# Altium schematic symbol library LATTICEPLDS_Library.SchLib: 291 symbols (part 23 of 32) (continued)
## LFECP33E-F672/FN672 (continued)
part F pins: U7 TCK, U20 DONE, V3 TDO, V4 TDI, V5 TMS, V20 CCLK, V21 CFG1, V22 PROGRAMN, V23 CFG0, V24 CFG2, V25 INITN
part A text: CORE POWER; VCC_CORE; VCC_JTAG; VCC_AUX; VCC_PLL
part B text: I/O BANKS 0 & 1; BANK 0; BANK 1
part C text: I/O BANKS 2 & 3; BANK 2; BANK 3
part D text: I/O BANKS 4 & 5; BANK 4; BANK 5
part E text: I/O BANKS 6 & 7; BANK 6; BANK 7
part F text: PROGRAMMING/CONFIGURATION; JTAG

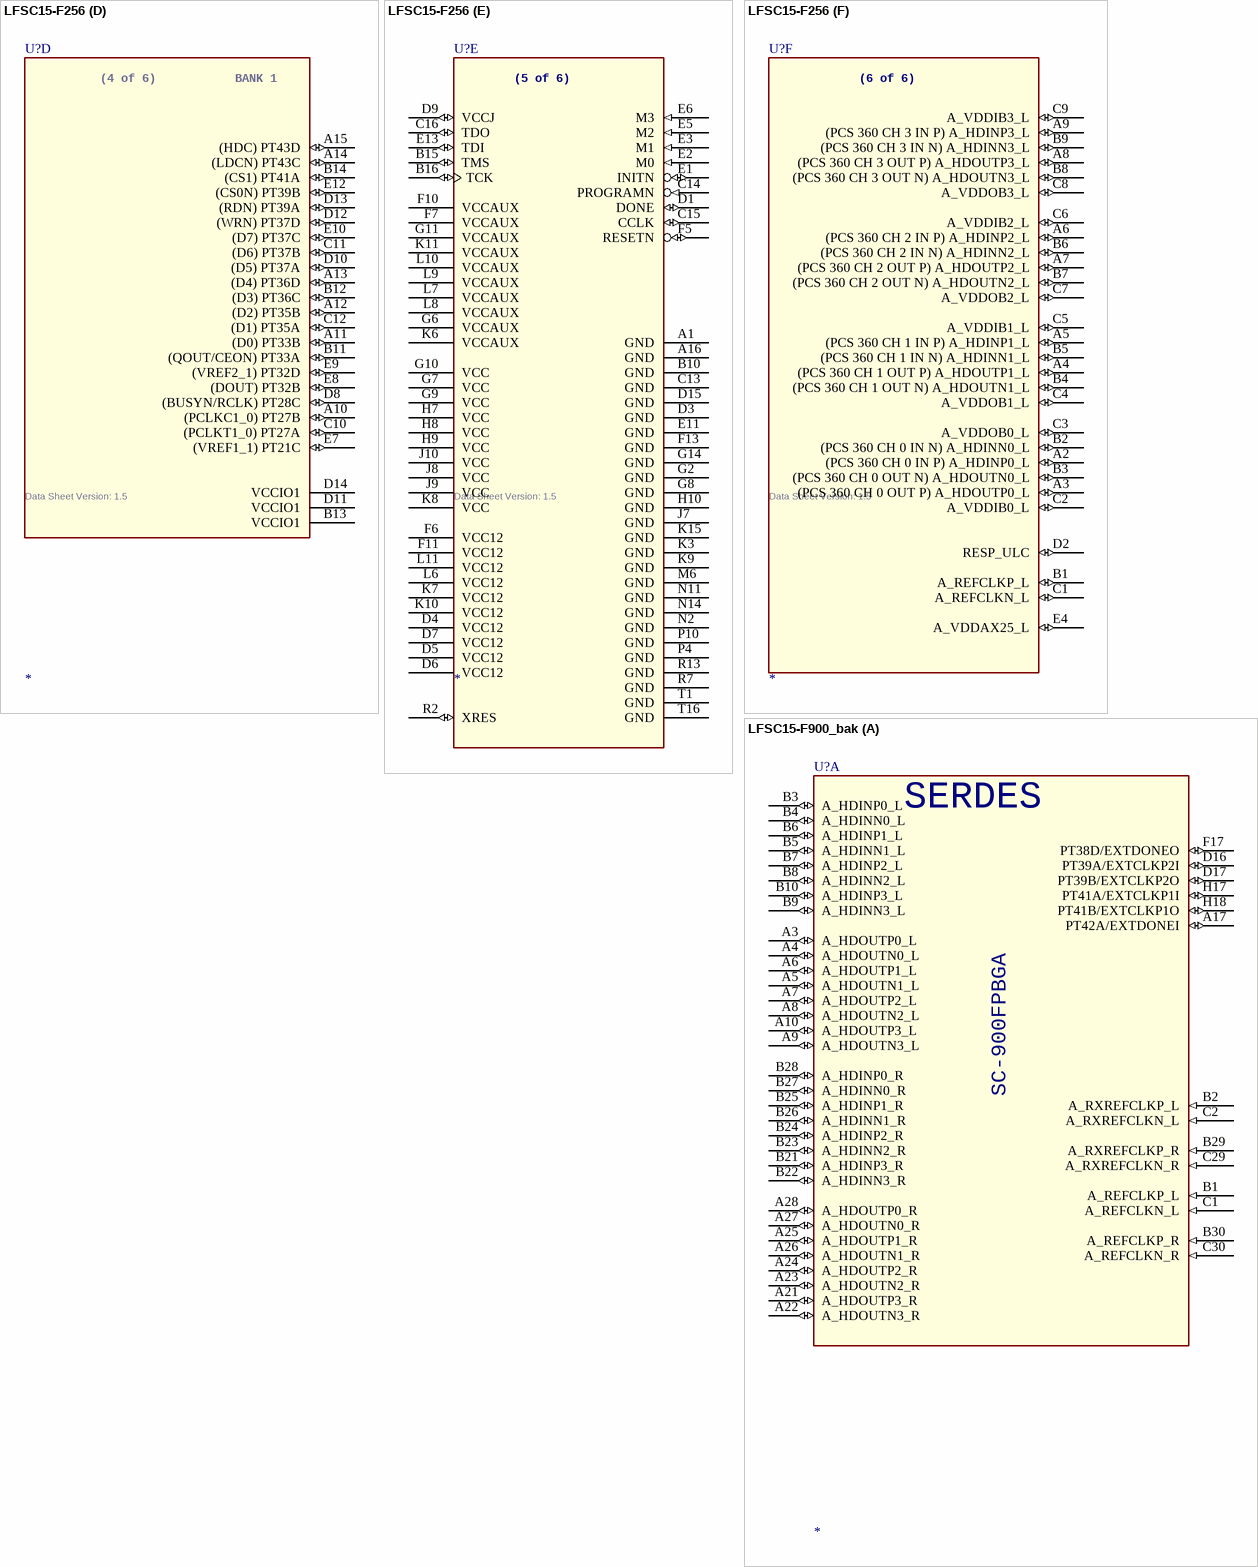
[diagram p224: symbols LFSC15-F256 to LFSC15-F900_bak]

## LFSC15-F256
designator U?  Data Sheet Version: 1.5
SPLIT_INST: TRUE; SWAP_INFO: (S1+S2+S3+S4+S5+S6)
part A pins: F1 PL15B (ULC_PLLC_IN_A/ULC_PLLC_FB_B) (io), F2 PL15A (ULC_PLLT_IN_A/ULC_PLLT_FB_B) (io), F3 PL17A (ULC_DLLT_IN_C/ULC_DLLT_FB_D) (io), F4 VCCIO7 (power), G1 PL17B (ULC_DLLC_IN_C/ULC_DLLC_FB_D) (io), G3 VCCIO7 (power), G4 PL18D (VREF2_7) (io), G5 PL22D (DIFFR_7) (io), H1 PL23A (PCLKT7_1) (io), H2 PL22B (io), H3 PL22A (io), H4 PL24C (PCLKT7_2) (io), H5 PL22C (VREF1_7) (io), H6 PL24D (PCLKC7_2) (io), J1 PL23B (PCLKC7_1) (io), J2 PL24A (PCLKT7_0) (io), J3 PL24B (PCLKC7_0) (io), J4 (PCLKT6_0) PL26A (io), J5 (PCLKT6_1) PL26C (io), J6 (PCLKC6_1) PL26D (io), K1 PL28A (io), K2 VCCIO6 (power), K4 (PCLKC6_2) PL28D (io), K5 (PCLKC6_0) PL26B (io), L1 PL28B (io), L2 (VREF1_6) PL31C (io), L3 PL35A (io), L4 (PCLKT6_2) PL28C (io), M1 PL37A (io), M2 (DIFFR_6) PL35D (io), M3 PL35B (io), M4 PL43B (io), M5 PL43A (io), N1 PL37B (io), N3 VCCIO6 (power), P1 (LLC_DLLT_IN_F/LLC_DLLT_FB_E) PL45A (io), P2 (VREF2_6) PL41D (io), P3 TEMP (io), R1 (LLC_DLLC_IN_F/LLC_DLLC_FB_E) PL45B (io)
part B pins: L5 PB13C (io), L12 PB43A (io), M7 PB15D (VREF2_5) (io), M8 PB21A (io), M9 PB21B (io), M10 (PCLKC4_2) PB35B (io), M11 VCCIO4 (power), M12 PB43B (io), M13 (LRC_DLLC_IN_C/LRC_DLLC_FB_D) PB48B (io), N4 PB3B (LLC_PLLC_IN_A/LLC_PLLC_FB_B) (io), N5 PB5D (VREF1_5) (io), N6 VCCIO5 (power), N7 PB17A (PCLKT5_2) (io), N8 PB17B (PCLKC5_2) (io), N9 PB31A (io), N10 PB31B (io), N12 PB39C (io), N13 (LRC_PLLT_IN_A/LRC_PLLT_FB_B) PB49A (io), N16 PB44B (io), P5 PB8A (io), P6 PB15A (PCLKT5_0) (io), P7 VCCIO5 (power), P8 PB24A (io), P9 PB24B (io), P11 (PCLKT4_2) PB35A (io), P12 (PCLKC4_1) PB36B (io), P13 VCCIO4 (power), P14 (LRC_PLLC_IN_A/LRC_PLLC_FB_B) PB49B (io), P15 (LRC_DLLT_IN_C/LRC_DLLT_FB_D) PB48A (io), P16 PB44A (io), R3 PB3A (LLC_PLLT_IN_A/LLC_PLLT_FB_B) (io), R4 VCCIO5 (power), R5 PB8B (io), R6 PB12A (PCLKT5_3) (io), R8 PB16A (PCLKT5_1) (io), R9 PB20A (io), R10 VCCIO4 (power), R11 PB28B (io), R12 PB32B (io), R14 (VREF1_4) PB47C (io), R15 (VREF2_4) PB37C (io), R16 (PCLKC4_3) PB40B (io), T2 PB3D (LLC_DLLC_IN_C/LLC_DLLC_FB_D) (io), T3 PB3C (LLC_DLLT_IN_C/LLC_DLLT_FB_D) (io), T4 PB9A (io), T5 PB9B (io), T6 PB12B (PCLKC5_3) (io), T7 PB15B (PCLKC5_0) (io), T8 PB16B (PCLKC5_1) (io), T9 PB20B (io), T10 PB28A (io), T11 PB32A (io), T12 (PCLKT4_1) PB36A (io), T13 (PCLKT4_0) PB37A (io), T14 (PCLKC4_0) PB37B (io), T15 (PCLKT4_3) PB40A (io)
part C pins: D16 (PCLKT2_2) PR24C (io), E14 (URC_PLLT_IN_A/URC_PLLT_FB_B) PR15A (io), E15 (URC_PLLC_IN_A/URC_PLLC_FB_B) PR15B (io), E16 (PCLKC2_2) PR24D (io), F8 PR22B (io), F9 PR22A (io), F12 VCCIO2 (power), F14 (URC_DLLT_IN_C/URC_DLLT_FB_D) PR17A (io), F15 (URC_DLLC_IN_C/URC_DLLC_FB_D)  PR17B (io), F16 PR28A (io), G12 (DIFFR_2) PR22D (io), G13 (VREF1_2) PR22C (io), G15 VCCIO2 (power), G16 (VREF2_2) PR18D (io), H11 (PCLKC2_0) PR24B (io), H12 (PCLKT2_0) PR24A (io), H13 (PCLKC2_1) PR23B (io), H14 (PCLKT2_1) PR23A  (io), H15 PR28B (io), H16 PR37A (io), J11 PR26D (PCLKC3_1) (io), J12 PR26C (PCLKT3_1) (io), J13 PR28D (PCLKC3_2) (io), J14 PR26A (PCLKT3_0) (io), J15 PR26B (PCLKC3_0) (io), J16 PR37B (io), K12 PR31C (VREF1_3) (io), K13 PR28C (PCLKT3_2) (io), K14 VCCIO3 (power), K16 PR41D (VREF2_3) (io), L13 PR35D (DIFFR_3) (io), L14 PR35B (io), L15 PR35A (io), L16 PR45A (LRC_DLLT_IN_F/LRC_DLLT_FB_E) (io), M14 PR43B (io), M15 PR43A (io), M16 PR45B (LRC_DLLC_IN_F/LRC_DLLC_FB_E) (io), N15 VCCIO3 (power)
part D pins: A10 (PCLKC1_0) PT27B (io), A11 (D0) PT33B (io), A12 (D2) PT35B (io), A13 (D4) PT36D (io), A14 (LDCN) PT43C (io), A15 (HDC) PT43D (io), B11 (QOUT/CEON) PT33A (io), B12 (D3) PT36C (io), B13 VCCIO1 (power), B14 (CS1) PT41A (io), C10 (PCLKT1_0) PT27A (io), C11 (D6) PT37B (io), C12 (D1) PT35A (io), D8 (BUSYN/RCLK) PT28C (io), D10 (D5) PT37A (io), D11 VCCIO1 (power), D12 (WRN) PT37D (io), D13 (RDN) PT39A (io), D14 VCCIO1 (power), E7 (VREF1_1) PT21C (io), E8 (DOUT) PT32B (io), E9 (VREF2_1) PT32D (io), E10 (D7) PT37C (io), E12 (CS0N) PT39B (io)
part E pins: A1 GND (power), A16 GND (power), B10 GND (power), B15 TMS (io), B16 TCK (io), C13 GND (power), C14 PROGRAMN (in), C15 CCLK (io), C16 TDO (io), D1 DONE (io), D3 GND (power), D4 VCC12 (power), D5 VCC12 (power), D6 VCC12 (power), D7 VCC12 (power), D9 VCCJ (io), D15 GND (power), E1 INITN (io), E2 M0 (in), E3 M1 (in), E5 M2 (in), E6 M3 (in), E11 GND (power), E13 TDI (io), F5 RESETN (io), F6 VCC12 (power), F7 VCCAUX (power), F10 VCCAUX (power), F11 VCC12 (power), F13 GND (power), G2 GND (power), G6 VCCAUX (power), G7 VCC (power), G8 GND (power), G9 VCC (power), G10 VCC (power), G11 VCCAUX (power), G14 GND (power), H7 VCC (power), H8 VCC (power), H9 VCC (power), H10 GND (power), J7 GND (power), J8 VCC (power), J9 VCC (power), J10 VCC (power), K3 GND (power), K6 VCCAUX (power), K7 VCC12 (power), K8 VCC (power), K9 GND (power), K10 VCC12 (power), K11 VCCAUX (power), K15 GND (power), L6 VCC12 (power), L7 VCCAUX (power), L8 VCCAUX (power), L9 VCCAUX (power), L10 VCCAUX (power), L11 VCC12 (power), M6 GND (power), N2 GND (power), N11 GND (power), N14 GND (power), P4 GND (power), P10 GND (power), R2 XRES (io), R7 GND (power), R13 GND (power), T1 GND (power), T16 GND (power)
part F pins: A2 (PCS 360 CH 0 IN P) A_HDINP0_L (io), A3 (PCS 360 CH 0 OUT P) A_HDOUTP0_L (io), A4 (PCS 360 CH 1 OUT P) A_HDOUTP1_L (io), A5 (PCS 360 CH 1 IN P) A_HDINP1_L (io), A6 (PCS 360 CH 2 IN P) A_HDINP2_L (io), A7 (PCS 360 CH 2 OUT P) A_HDOUTP2_L (io), A8 (PCS 360 CH 3 OUT P) A_HDOUTP3_L (io), A9 (PCS 360 CH 3 IN P) A_HDINP3_L (io), B1 A_REFCLKP_L (io), B2 (PCS 360 CH 0 IN N) A_HDINN0_L (io), B3 (PCS 360 CH 0 OUT N) A_HDOUTN0_L (io), B4 (PCS 360 CH 1 OUT N) A_HDOUTN1_L (io), B5 (PCS 360 CH 1 IN N) A_HDINN1_L (io), B6 (PCS 360 CH 2 IN N) A_HDINN2_L (io), B7 (PCS 360 CH 2 OUT N) A_HDOUTN2_L (io), B8 (PCS 360 CH 3 OUT N) A_HDOUTN3_L (io), B9 (PCS 360 CH 3 IN N) A_HDINN3_L (io), C1 A_REFCLKN_L (io), C2 A_VDDIB0_L (io), C3 A_VDDOB0_L (io), C4 A_VDDOB1_L (io), C5 A_VDDIB1_L (io), C6 A_VDDIB2_L (io), C7 A_VDDOB2_L (io), C8 A_VDDOB3_L (io), C9 A_VDDIB3_L (io), D2 RESP_ULC (io), E4 A_VDDAX25_L (io)
part A text: BANK 7; (1 of 6); BANK 6
part B text: BANK 5; (2 of 6); BANK 4
part C text: BANK 3; (3 of 6); BANK 2
part D text: (4 of 6); BANK 1
part E text: (5 of 6)
part F text: (6 of 6)

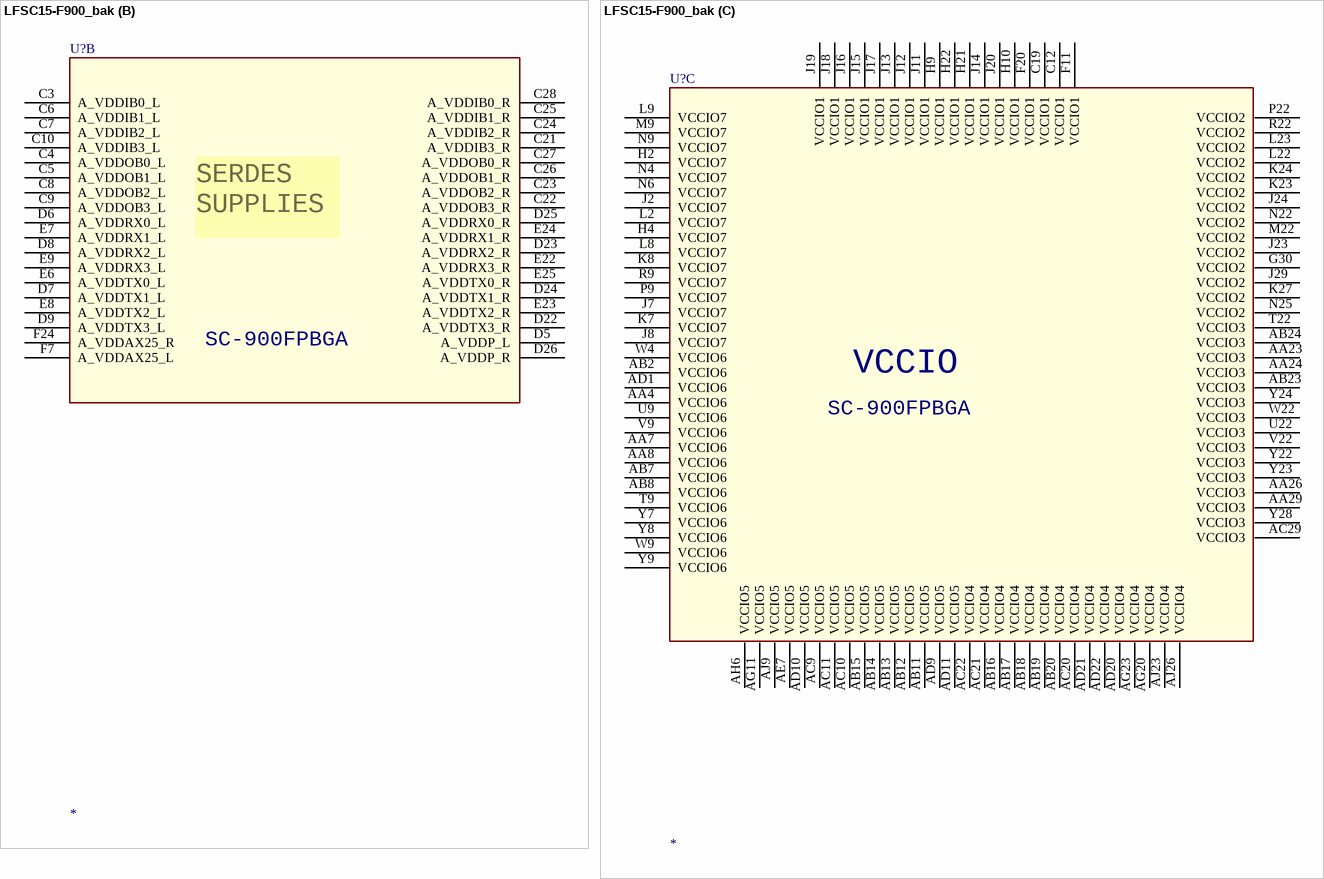
[diagram p225: symbol LFSC15-F900_bak]

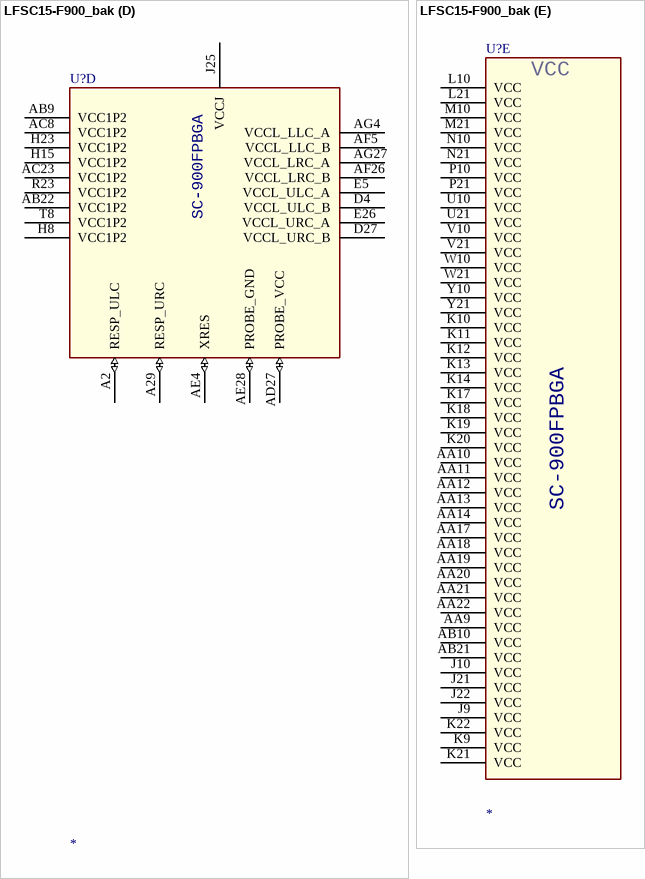
[diagram p226: symbol LFSC15-F900_bak]

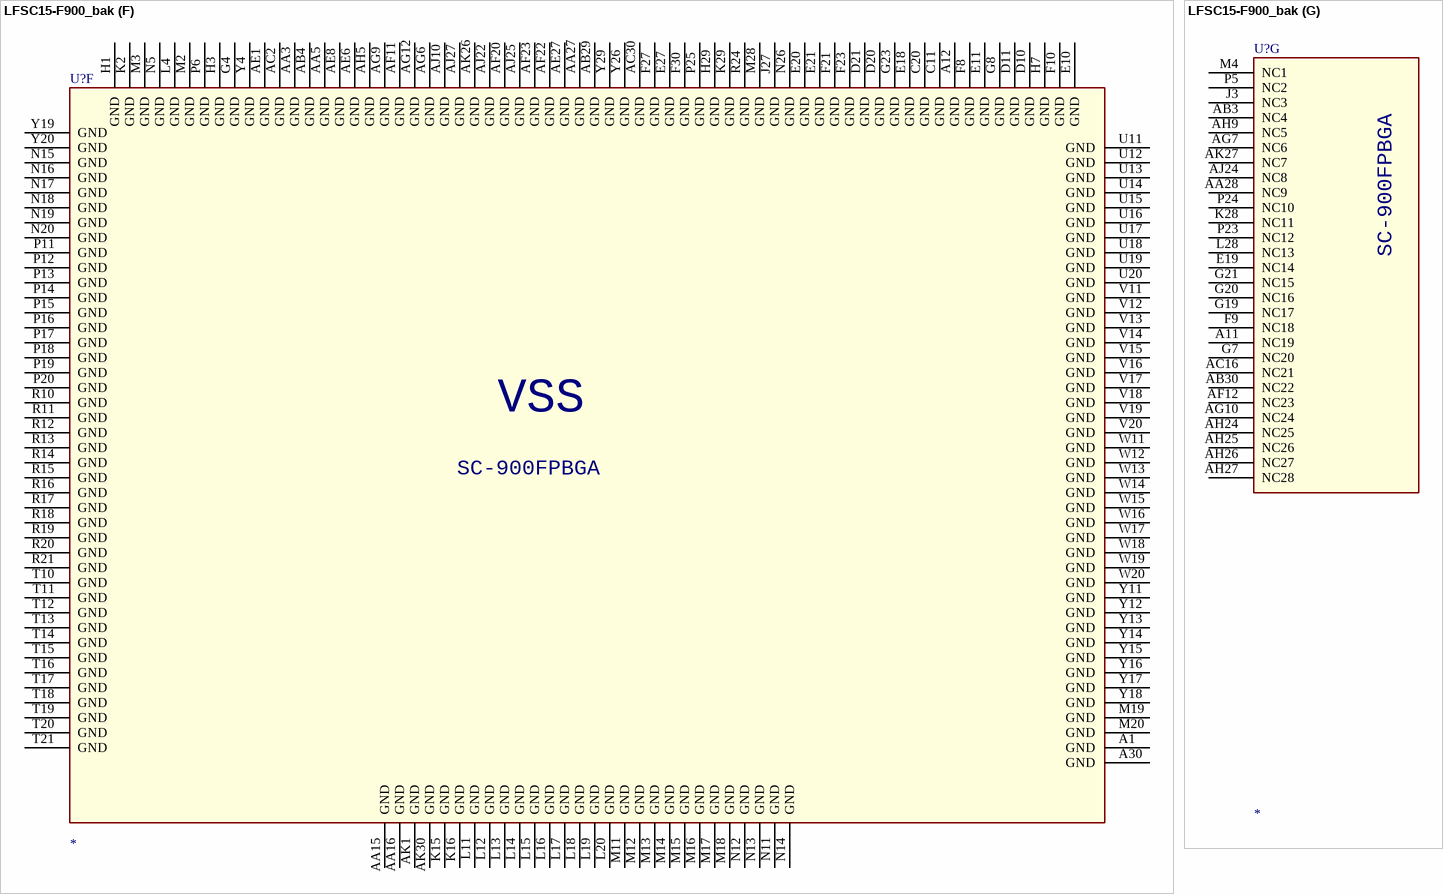
[diagram p227: symbol LFSC15-F900_bak]

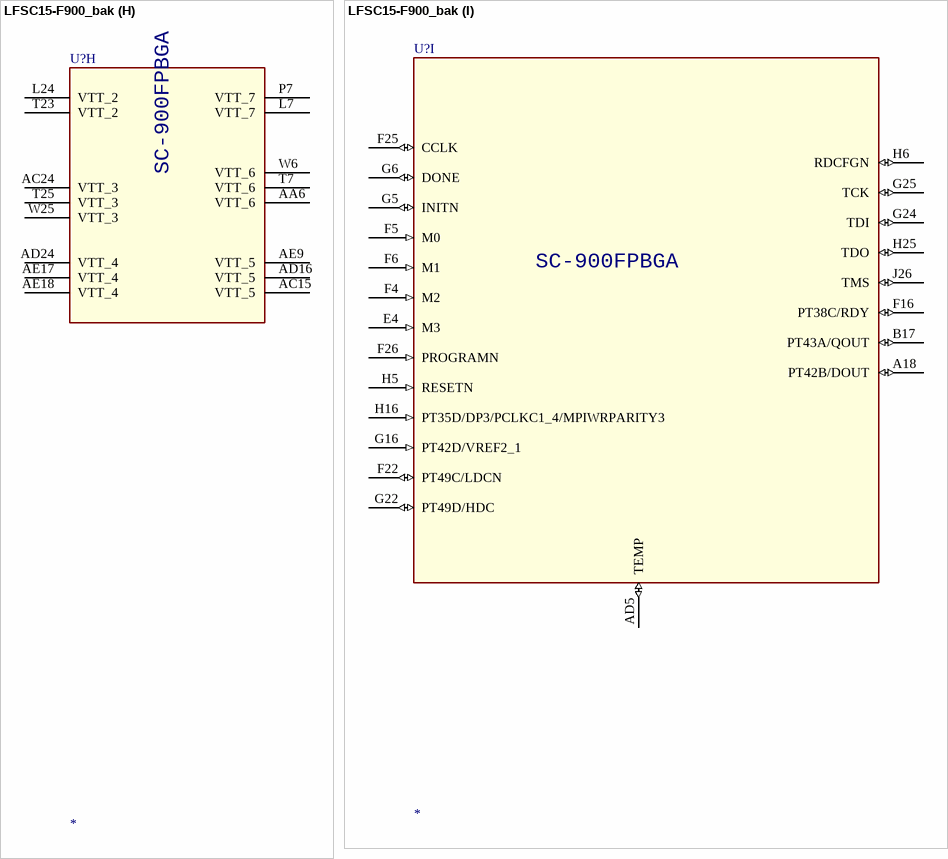
[diagram p228: symbol LFSC15-F900_bak]

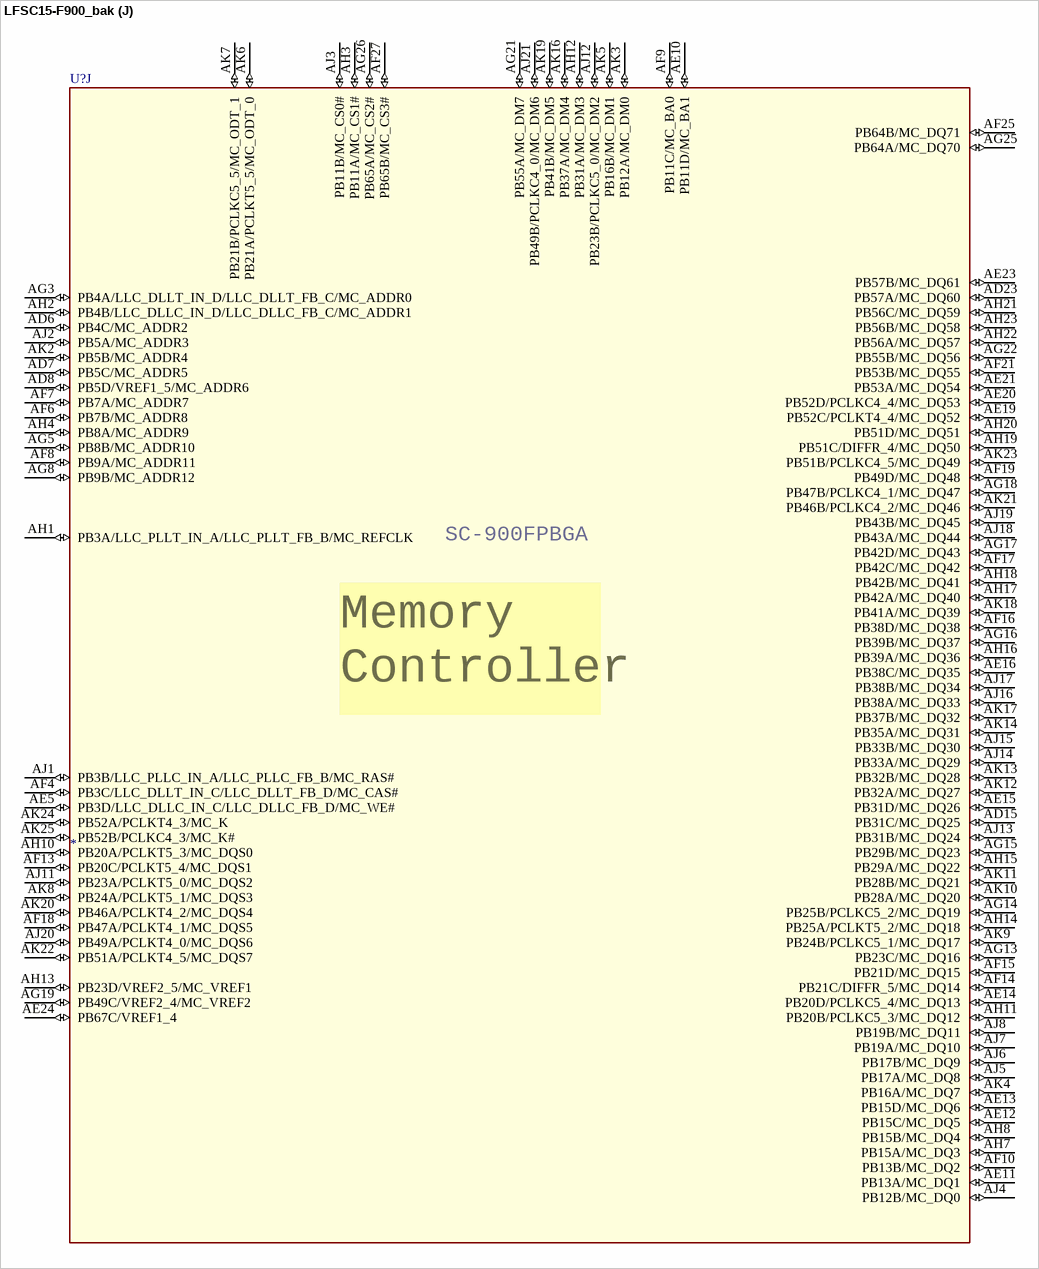
[diagram p229: symbol LFSC15-F900_bak]

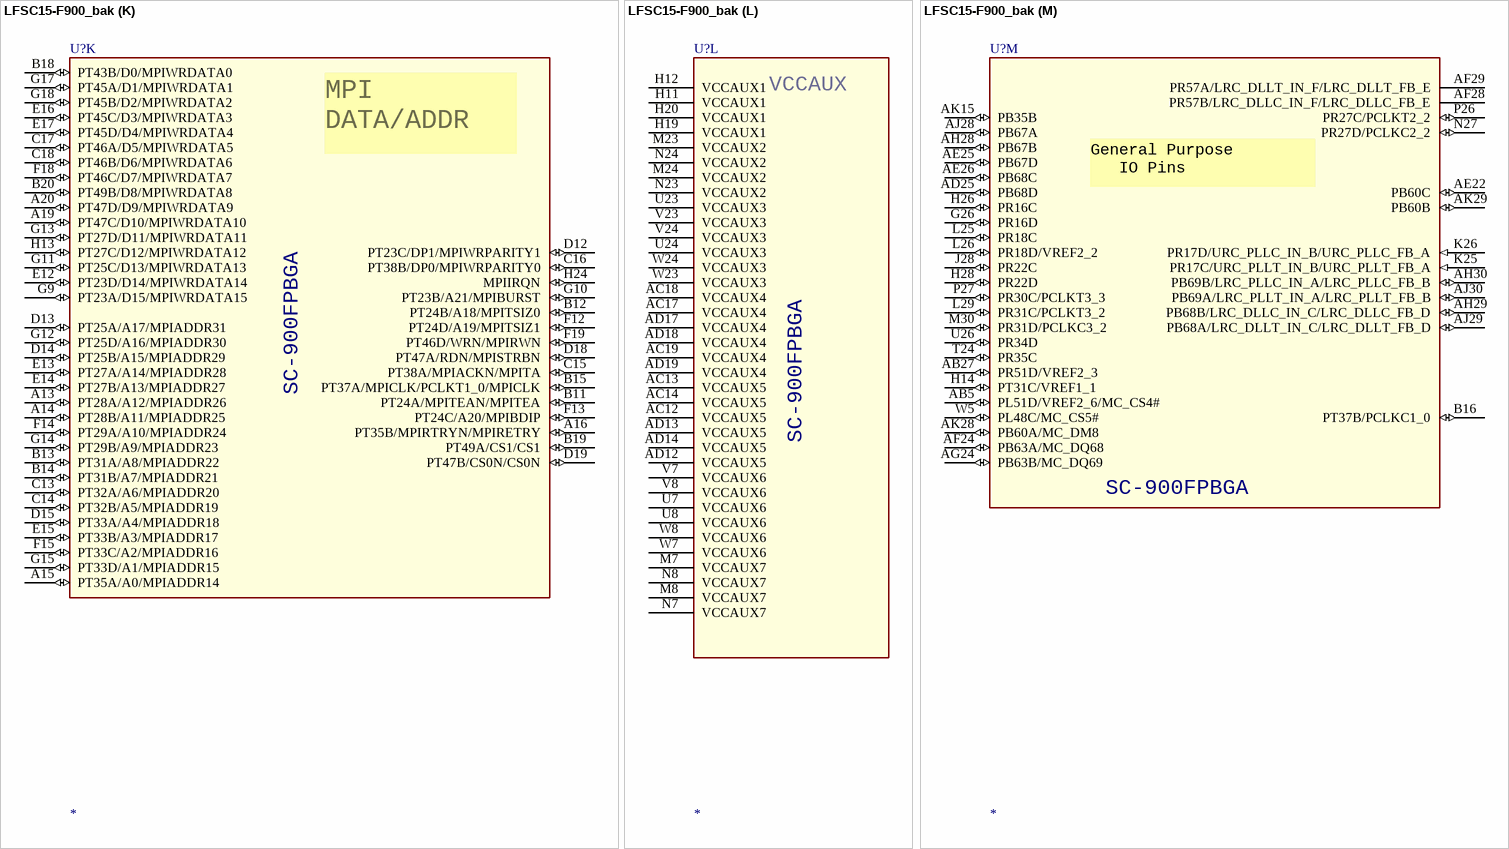
[diagram p230: symbol LFSC15-F900_bak]

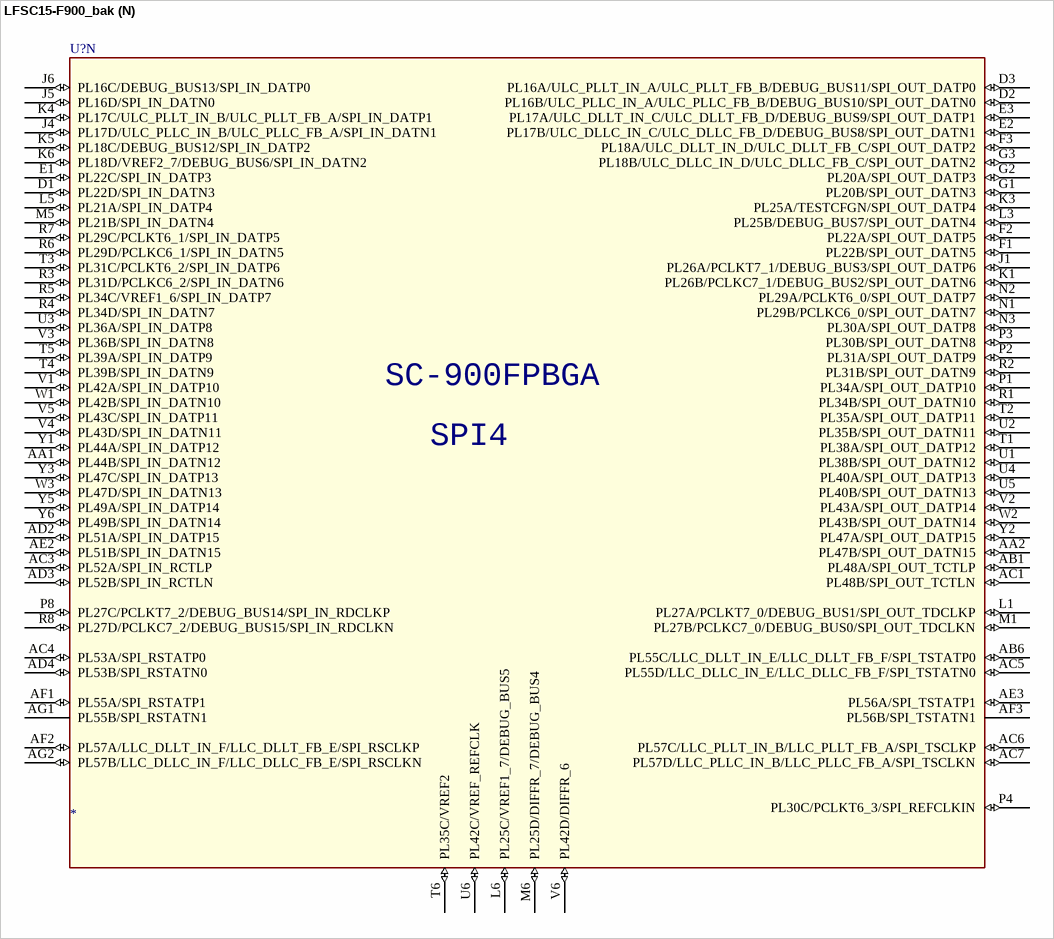
[diagram p231: symbol LFSC15-F900_bak]

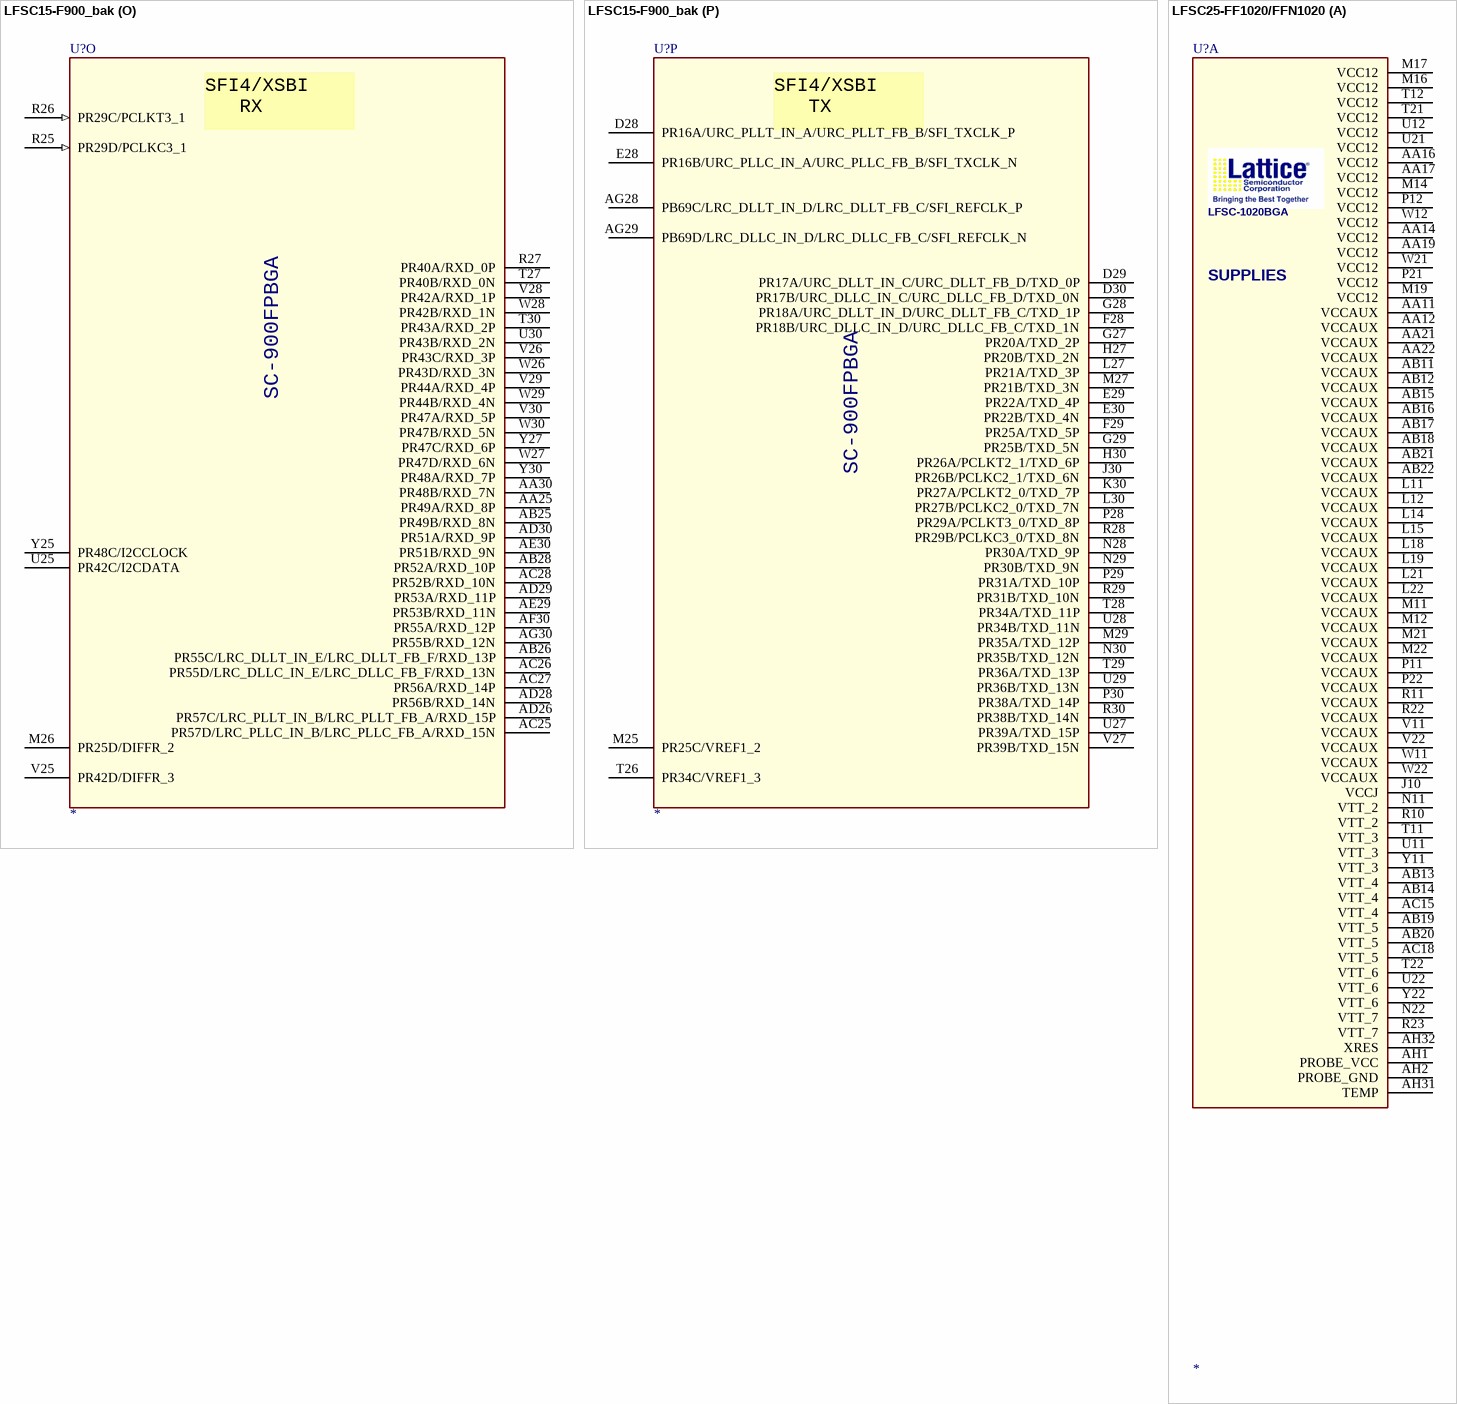
[diagram p232: symbols LFSC15-F900_bak to LFSC25-FF1020/FFN1020]